# Altium footprint library Wurth_Elektronik_Electromechanic_Wire_to_Board_Connectors_rev16a.PCBLIB: 662 footprints (part 3 of 42)
Each footprint in its own frame and in the unit in brackets; x right, y up, seen from the top. Pads: shape width x height; smd on the part's side, far side on the other; paste and mask are expansions set on the pad; w line width, h text height; cw(c..) or ccw(c..) is an arc to the next point about the centre after c.
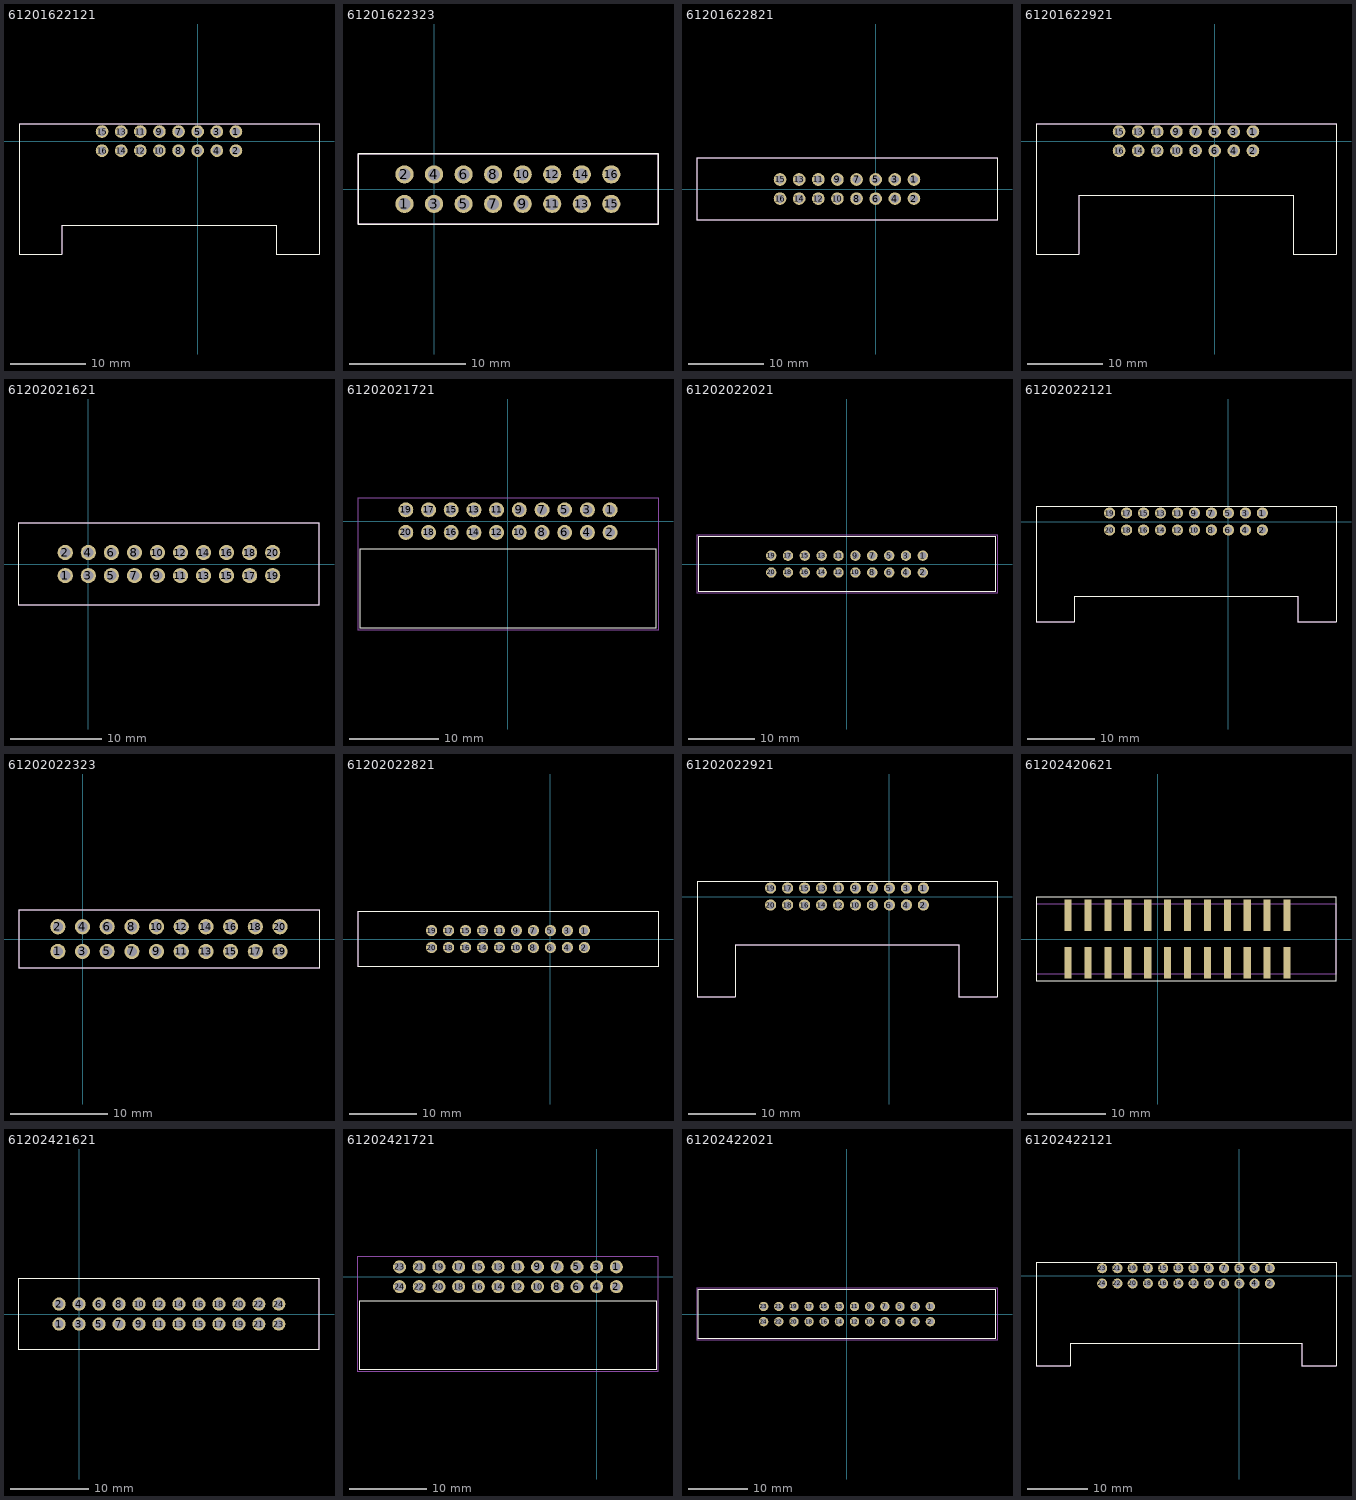
[diagram p2: the footprints below, top view; thin cyan lines are the x and y axes]

## 61201622121 [mil]
pads (16):
  round 66 hole 44: 1(200,50) 2(200,-50) 3(100,50) 4(100,-50) 5(0,50) 6(0,-50) 7(-100,50) 8(-100,-50) 9(-200,50) 10(-200,-50) 11(-300,50) 12(-300,-50) 13(-400,50) 14(-400,-50) 15(-500,50) 16(-500,-50)
Top Overlay:
  lines w5: -933.86,-590.55 -933.86,90 634,90 634,-590.55 410,-590.55 410,-440.94 -709.45,-440.94 -709.45,-590.55 -933.86,-590.55
Mechanical 2:
  text ">NAME" at -250,150 h77.5
Mechanical 4:
  text ">VALUE" at -311.81,-664.57 h77.5
Mechanical 16:
  lines w5: -933.86,-590.55 -709.45,-590.55 -709.45,-440.94 410,-440.94 410,-590.55 634,-590.55 634,90 -933.86,90 -933.86,-590.55
  text "1" at 175,25 h77.5
  text "16" at -550,-75 h77.5

## 61201622323 [mil]
pads (16):
  round 61.5 hole 41: 1(-100,-50) 2(-100,50) 3(0,-50) 4(0,50) 5(100,-50) 6(100,50) 7(200,-50) 8(200,50) 9(300,-50) 10(300,50) 11(400,-50) 12(400,50) 13(500,-50) 14(500,50) 15(600,-50) 16(600,50)
Top Overlay:
  lines w5: -257.28,-118.11 758,-118.11 758,119 -257.28,119 -257.28,-118.11
Mechanical 2:
  text ">NAME" at 150,150 h77.5
Mechanical 4:
  text ">VALUE" at 125,-200 h77.5
Mechanical 16:
  lines w5: -257.28,-118.11 758,-118.11 758,119 -257.28,119 -257.28,-118.11
  text "1" at -125,-75 h77.5
  text "16" at 550,25 h77.5

## 61201622821 [mil]
pads (16):
  round 66 hole 44: 1(200,50) 2(200,-50) 3(100,50) 4(100,-50) 5(0,50) 6(0,-50) 7(-100,50) 8(-100,-50) 9(-200,50) 10(-200,-50) 11(-300,50) 12(-300,-50) 13(-400,50) 14(-400,-50) 15(-500,50) 16(-500,-50)
Top Overlay:
  lines w5: -933.86,-163.39 634,-163.39 634,164 -933.86,164 -933.86,-163.39
Mechanical 2:
  text ">NAME" at -250,200 h77.5
Mechanical 4:
  text ">VALUE" at -275,-250 h77.5
Mechanical 16:
  lines w5: -933.86,-163.39 634,-163.39 634,164 -933.86,164 -933.86,-163.39
  text "1" at 175,25 h77.5
  text "16" at -550,-75 h77.5

## 61201622921 [mil]
pads (16):
  round 66 hole 44: 1(200,50) 2(200,-50) 3(100,50) 4(100,-50) 5(0,50) 6(0,-50) 7(-100,50) 8(-100,-50) 9(-200,50) 10(-200,-50) 11(-300,50) 12(-300,-50) 13(-400,50) 14(-400,-50) 15(-500,50) 16(-500,-50)
Top Overlay:
  lines w5: -933.86,-590.16 -933.86,90 634,90 634,-590.16 410,-590.16 410,-283.46 -709.45,-283.46 -709.45,-590.16 -933.86,-590.16
Mechanical 2:
  text ">NAME" at -250,150 h77.5
Mechanical 4:
  text ">VALUE" at -311.81,-507.09 h77.5
Mechanical 16:
  lines w5: -933.86,-590.16 -709.45,-590.16 -709.45,-283.46 410,-283.46 410,-590.16 634,-590.16 634,90 -933.86,90 -933.86,-590.16
  text "1" at 175,25 h77.5
  text "16" at -550,-75 h77.5

## 61202021621 [mil]
pads (20):
  round 66 hole 44: 1(-100,-50) 2(-100,50) 3(0,-50) 4(0,50) 5(100,-50) 6(100,50) 7(200,-50) 8(200,50) 9(300,-50) 10(300,50) 11(400,-50) 12(400,50) 13(500,-50) 14(500,50) 15(600,-50) 16(600,50) 17(700,-50) 18(700,50) 19(800,-50) 20(800,50)
Top Overlay:
  lines w5: -300.79,-179.13 1001,-179.13 1001,180 -300.79,180 -300.79,-179.13
Mechanical 2:
  text ">NAME" at 225,200 h77.5
Mechanical 4:
  text ">VALUE" at 200,-250 h77.5
Mechanical 16:
  lines w5: -300.79,-179.13 1001,-179.13 1001,180 -300.79,180 -300.79,-179.13
  text "1" at -125,-75 h77.5
  text "20" at 757,22 h77.5

## 61202021721 [mil]
pads (20):
  round 66 hole 44: 1(450,50) 2(450,-50) 3(350,50) 4(350,-50) 5(250,50) 6(250,-50) 7(150,50) 8(150,-50) 9(50,50) 10(50,-50) 11(-50,50) 12(-50,-50) 13(-150,50) 14(-150,-50) 15(-250,50) 16(-250,-50) 17(-350,50) 18(-350,-50) 19(-450,50) 20(-450,-50)
Top Overlay:
  lines w5: -650.79,-470.87 651,-470.87 651,-122.44 -650.79,-122.44 -650.79,-470.87
Mechanical 2:
  text ">NAME" at 706,-250.7 h77.5
Mechanical 4:
  text ">VALUE" at 706,-348.7 h77.5
Mechanical 16:
  text "1" at 425,25 h77.5
  text "20" at -475,-75 h77.5
  text "2" at 425,-75 h77.5
Mechanical 27:
  lines w5: -660.63,-480.71 661,-480.71 661,103 -660.63,103 -660.63,-480.71

## 61202022021 [mil]
pads (20):
  round 61.5 hole 41: 1(450,50) 2(450,-50) 3(350,50) 4(350,-50) 5(250,50) 6(250,-50) 7(150,50) 8(150,-50) 9(50,50) 10(50,-50) 11(-50,50) 12(-50,-50) 13(-150,50) 14(-150,-50) 15(-250,50) 16(-250,-50) 17(-350,50) 18(-350,-50) 19(-450,50) 20(-450,-50)
Top Overlay:
  lines w5: -879.92,-163.39 880,-163.39 880,164 -879.92,164 -879.92,-163.39
Mechanical 2:
  text ">NAME" at -125,200 h77.5
Mechanical 4:
  text ">VALUE" at -150,-250 h77.5
Mechanical 16:
  text "1" at 425,25 h77.5
  text "20" at -500,-75 h77.5
  text "2" at 425,-75 h77.5
Mechanical 27:
  lines w5: -889.76,-173.23 890,-173.23 890,174 -889.76,174 -889.76,-173.23

## 61202022121 [mil]
pads (20):
  round 66 hole 44: 1(200,50) 2(200,-50) 3(100,50) 4(100,-50) 5(0,50) 6(0,-50) 7(-100,50) 8(-100,-50) 9(-200,50) 10(-200,-50) 11(-300,50) 12(-300,-50) 13(-400,50) 14(-400,-50) 15(-500,50) 16(-500,-50) 17(-600,50) 18(-600,-50) 19(-700,50) 20(-700,-50)
Top Overlay:
  lines w5: -1133.86,-590.55 -1133.86,90 634,90 634,-590.55 410,-590.55 410,-440.94 -909.45,-440.94 -909.45,-590.55 -1133.86,-590.55
Mechanical 2:
  text ">NAME" at -425,125 h77.5
Mechanical 4:
  text ">VALUE" at -461.81,-664.57 h77.5
Mechanical 16:
  lines w5: -1133.86,-590.55 -909.45,-590.55 -909.45,-440.94 410,-440.94 410,-590.55 634,-590.55 634,90 -1133.86,90 -1133.86,-590.55
  text "1" at 175,25 h77.5
  text "20" at -750,-75 h77.5

## 61202022323 [mil]
pads (20):
  round 61.5 hole 41: 1(-100,-50) 2(-100,50) 3(0,-50) 4(0,50) 5(100,-50) 6(100,50) 7(200,-50) 8(200,50) 9(300,-50) 10(300,50) 11(400,-50) 12(400,50) 13(500,-50) 14(500,50) 15(600,-50) 16(600,50) 17(700,-50) 18(700,50) 19(800,-50) 20(800,50)
Top Overlay:
  lines w5: -257.28,-118.11 958,-118.11 958,119 -257.28,119 -257.28,-118.11
Mechanical 2:
  text ">NAME" at 275,150 h77.5
Mechanical 4:
  text ">VALUE" at 250,-200 h77.5
Mechanical 16:
  lines w5: -257.28,-118.11 958,-118.11 958,119 -257.28,119 -257.28,-118.11
  text "1" at -125,-75 h77.5
  text "20" at 750,25 h77.5

## 61202022821 [mil]
pads (20):
  round 66 hole 44: 1(200,50) 2(200,-50) 3(100,50) 4(100,-50) 5(0,50) 6(0,-50) 7(-100,50) 8(-100,-50) 9(-200,50) 10(-200,-50) 11(-300,50) 12(-300,-50) 13(-400,50) 14(-400,-50) 15(-500,50) 16(-500,-50) 17(-600,50) 18(-600,-50) 19(-700,50) 20(-700,-50)
Top Overlay:
  lines w5: -1133.86,-163.39 634,-163.39 634,164 -1133.86,164 -1133.86,-163.39
Mechanical 2:
  text ">NAME" at -375,200 h77.5
Mechanical 4:
  text ">VALUE" at -400,-250 h77.5
Mechanical 16:
  lines w5: -1133.86,-163.39 634,-163.39 634,164 -1133.86,164 -1133.86,-163.39
  text "1" at 175,25 h77.5
  text "20" at -750,-75 h77.5

## 61202022921 [mil]
pads (20):
  round 66 hole 44: 1(200,50) 2(200,-50) 3(100,50) 4(100,-50) 5(0,50) 6(0,-50) 7(-100,50) 8(-100,-50) 9(-200,50) 10(-200,-50) 11(-300,50) 12(-300,-50) 13(-400,50) 14(-400,-50) 15(-500,50) 16(-500,-50) 17(-600,50) 18(-600,-50) 19(-700,50) 20(-700,-50)
Top Overlay:
  lines w5: -1133.86,-590.16 -1133.86,90 634,90 634,-590.16 410,-590.16 410,-283.46 -909.45,-283.46 -909.45,-590.16 -1133.86,-590.16
Mechanical 2:
  text ">NAME" at -425,125 h77.5
Mechanical 4:
  text ">VALUE" at -461.81,-507.09 h77.5
Mechanical 16:
  lines w5: -1133.86,-590.16 -909.45,-590.16 -909.45,-283.46 410,-283.46 410,-590.16 634,-590.16 634,90 -1133.86,90 -1133.86,-590.16
  text "1" at 175,25 h77.5
  text "20" at -750,-75 h77.5

## 61202420621 [mil]
pads (24):
  rect 36x158 smd: 1(-450,-118.11) 2(-450,119) 3(-350,-118.11) 4(-350,119) 5(-250,-118.11) 6(-250,119) 7(-150,-118.11) 8(-150,119) 9(-50,-118.11) 10(-50,119) 11(50,-118.11) 12(50,119) 13(150,-118.11) 14(150,119) 15(250,-118.11) 16(250,119) 17(350,-118.11) 18(350,119) 19(450,-118.11) 20(450,119) 21(550,-118.11) 22(550,119) 23(650,-118.11) 24(650,119)
Top Overlay:
  lines w5: -611.42,-208.66 896,-208.66 896,209 -611.42,209 -611.42,-208.66
Mechanical 2:
  text ">NAME" at 0,250 h77.5
Mechanical 4:
  text ">VALUE" at 25,-300 h77.5
Mechanical 16:
  lines w5: -611.42,-173.23 -611.42,174 896,174 896,-173.23 -611.42,-173.23
  text "1" at -475,-125 h77.5
  text "24" at 600,75 h77.5

## 61202421621 [mil]
pads (24):
  round 66 hole 44: 1(-100,-50) 2(-100,50) 3(0,-50) 4(0,50) 5(100,-50) 6(100,50) 7(200,-50) 8(200,50) 9(300,-50) 10(300,50) 11(400,-50) 12(400,50) 13(500,-50) 14(500,50) 15(600,-50) 16(600,50) 17(700,-50) 18(700,50) 19(800,-50) 20(800,50) 21(900,-50) 22(900,50) 23(1000,-50) 24(1000,50)
Top Overlay:
  lines w5: -300.79,-179.13 1201,-179.13 1201,180 -300.79,180 -300.79,-179.13
Mechanical 2:
  text ">NAME" at 325,200 h77.5
Mechanical 4:
  text ">VALUE" at 300,-250 h77.5
Mechanical 16:
  lines w5: -300.79,-179.13 1201,-179.13 1201,180 -300.79,180 -300.79,-179.13
  text "1" at -125,-75 h77.5
  text "24" at 957,22 h77.5

## 61202421721 [mil]
pads (24):
  round 66 hole 44: 1(100,50) 2(100,-50) 3(0,50) 4(0,-50) 5(-100,50) 6(-100,-50) 7(-200,50) 8(-200,-50) 9(-300,50) 10(-300,-50) 11(-400,50) 12(-400,-50) 13(-500,50) 14(-500,-50) 15(-600,50) 16(-600,-50) 17(-700,50) 18(-700,-50) 19(-800,50) 20(-800,-50) 21(-900,50) 22(-900,-50) 23(-1000,50) 24(-1000,-50)
Top Overlay:
  lines w5: -1200.79,-470.87 301,-470.87 301,-122.44 -1200.79,-122.44 -1200.79,-470.87
Mechanical 2:
  text ">NAME" at 357,-250.7 h77.5
Mechanical 4:
  text ">VALUE" at 357,-348.7 h77.5
Mechanical 16:
  lines w5: -1210.63,-480.71 311,-480.71 311,103 -1210.63,103 -1210.63,-480.71
  text "1" at 75,25 h77.5
  text "24" at -1025,-75 h77.5
  text "2" at 75,-75 h77.5

## 61202422021 [mil]
pads (24):
  round 61.5 hole 41: 1(550,50) 2(550,-50) 3(450,50) 4(450,-50) 5(350,50) 6(350,-50) 7(250,50) 8(250,-50) 9(150,50) 10(150,-50) 11(50,50) 12(50,-50) 13(-50,50) 14(-50,-50) 15(-150,50) 16(-150,-50) 17(-250,50) 18(-250,-50) 19(-350,50) 20(-350,-50) 21(-450,50) 22(-450,-50) 23(-550,50) 24(-550,-50)
Top Overlay:
  lines w5: -979.92,-163.39 980,-163.39 980,164 -979.92,164 -979.92,-163.39
Mechanical 2:
  text ">NAME" at -25,200 h77.5
Mechanical 4:
  text ">VALUE" at -50,-250 h77.5
Mechanical 16:
  text "1" at 525,25 h77.5
  text "24" at -600,-75 h77.5
  text "2" at 525,-75 h77.5
Mechanical 27:
  lines w5: -989.76,-173.23 990,-173.23 990,174 -989.76,174 -989.76,-173.23

## 61202422121 [mil]
pads (24):
  round 66 hole 44: 1(200,50) 2(200,-50) 3(100,50) 4(100,-50) 5(0,50) 6(0,-50) 7(-100,50) 8(-100,-50) 9(-200,50) 10(-200,-50) 11(-300,50) 12(-300,-50) 13(-400,50) 14(-400,-50) 15(-500,50) 16(-500,-50) 17(-600,50) 18(-600,-50) 19(-700,50) 20(-700,-50) 21(-800,50) 22(-800,-50) 23(-900,50) 24(-900,-50)
Top Overlay:
  lines w5: -1333.86,-590.55 -1333.86,90 634,90 634,-590.55 410,-590.55 410,-440.94 -1109.45,-440.94 -1109.45,-590.55 -1333.86,-590.55
Mechanical 2:
  text ">NAME" at -425,125 h77.5
Mechanical 4:
  text ">VALUE" at -461.81,-664.57 h77.5
Mechanical 16:
  lines w5: -1333.86,-590.55 -1109.45,-590.55 -1109.45,-440.94 410,-440.94 410,-590.55 634,-590.55 634,90 -1333.86,90 -1333.86,-590.55
  text "1" at 175,25 h77.5
  text "24" at -925,-75 h77.5